# Altium footprint library ICs And Semiconductors SMD.PcbLib: 943 footprints (part 60 of 60)
Each footprint in its own frame and in the unit in brackets; x right, y up, seen from the top. Pads: shape width x height; smd on the part's side, far side on the other; paste and mask are expansions set on the pad; w line width, h text height; cw(c..) or ccw(c..) is an arc to the next point about the centre after c.
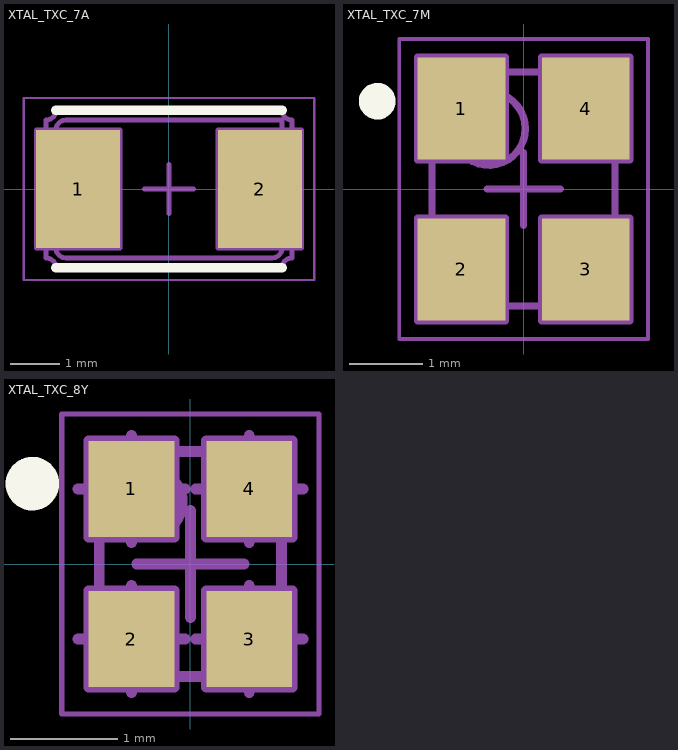
[diagram p59: the footprints below, top view; thin cyan lines are the x and y axes]

## XTAL_TXC_7A [mm] "2 Pins, 3.2x5mm, SMD Glass Seam Sealing Crystal, 7A Serie"
height 1.2
pads (2):
  rect 1.7x2.4 smd: 1(-1.85,0) 2(1.85,0)
Top Overlay:
  lines w0.2: -2.3,-1.6 2.3,-1.6 ; -2.3,1.6 2.3,1.6
Mechanical 8:
  lines w0.1: -2.35,0 -1.85,0 ; -1.85,-0.5 -1.85,0 ; -1.85,0.5 -1.85,0 ; -1.35,0 -1.85,0 ; -0.5,0 0,0 ; 0,-0.5 0,0 ; 0,0.5 0,0 ; 0.5,0 0,0 ; 1.35,0 1.85,0 ; 1.85,-0.5 1.85,0 ; 1.85,0.5 1.85,0 ; 2.35,0 1.85,0 ; -2.7,-1.2 -1,-1.2 -1,1.2 -2.7,1.2 -2.7,-1.2 ; 1,-1.2 2.7,-1.2 2.7,1.2 1,1.2 1,-1.2
Mechanical 14:
  lines w0.1: -2.5,-1.4 cw(c-2.5,-1.6) -2.3,-1.6 2.3,-1.6 cw(c2.5,-1.6) 2.5,-1.4 2.5,-0.5 cw(c2.5,-0.4) 2.4,-0.4 2.4,0.4 cw(c2.5,0.4) 2.5,0.5 2.5,1.4 cw(c2.5,1.6) 2.3,1.6 -2.3,1.6 cw(c-2.5,1.6) -2.5,1.4 -2.5,0.5 cw(c-2.5,0.4) -2.4,0.4 -2.4,-0.4 cw(c-2.5,-0.4) -2.5,-0.5 -2.5,-1.4 ; -2.3,-1.2 ccw(c-2.1,-1.2) -2.1,-1.4 2.1,-1.4 ccw(c2.1,-1.2) 2.3,-1.2 2.3,1.4 -2.1,1.4 ccw(c-2.1,1.2) -2.3,1.2 -2.3,-1.2
Mechanical 15:
  lines w0.05: -2.95,-1.85 2.95,-1.85 2.95,1.85 -2.95,1.85 -2.95,-1.85
3D body "XTAL_TXC_7A.stp": height 1.2, standoff 0, extent -2.501,-1.6 2.5,1.6

## XTAL_TXC_7M [mm] "4 Pins, 2.5x3.2mm, SMD Sealing Crystal, 7M Serie"
height 0.8
pads (4):
  rect 1.2x1.4 smd: 1(-0.85,1.1) 2(-0.85,-1.1) 3(0.85,-1.1) 4(0.85,1.1)
Top Overlay:
  circle w0.25: c-2,1.2 r0.125
Mechanical 8:
  lines w0.1: -1.35,-1.1 -0.85,-1.1 ; -1.35,1.1 -0.85,1.1 ; -0.85,-1.6 -0.85,-1.1 ; -0.85,-0.6 -0.85,-1.1 ; -0.85,0.6 -0.85,1.1 ; -0.85,1.6 -0.85,1.1 ; -0.5,0 0,0 ; -0.35,-1.1 -0.85,-1.1 ; -0.35,1.1 -0.85,1.1 ; 0,-0.5 0,0 ; 0,0.5 0,0 ; 0.35,-1.1 0.85,-1.1 ; 0.35,1.1 0.85,1.1 ; 0.5,0 0,0 ; 0.85,-1.6 0.85,-1.1 ; 0.85,-0.6 0.85,-1.1 ; 0.85,0.6 0.85,1.1 ; 0.85,1.6 0.85,1.1 ; 1.35,-1.1 0.85,-1.1 ; 1.35,1.1 0.85,1.1 ; -1.45,-1.8 -0.25,-1.8 -0.25,-0.4 -1.45,-0.4 -1.45,-1.8 ; -1.45,0.4 -0.25,0.4 -0.25,1.8 -1.45,1.8 -1.45,0.4 ; 0.25,-1.8 1.45,-1.8 1.45,-0.4 0.25,-0.4 0.25,-1.8 ; 0.25,0.4 1.45,0.4 1.45,1.8 0.25,1.8 0.25,0.4
Mechanical 14:
  circle w0.1: c-0.475,0.825 r0.5
  lines w0.1: -1.25,-1.5 cw(c-1.25,-1.6) -1.15,-1.6 1.15,-1.6 cw(c1.25,-1.6) 1.25,-1.5 1.25,1.5 cw(c1.25,1.6) 1.15,1.6 -1.15,1.6 cw(c-1.25,1.6) -1.25,1.5 -1.25,-1.5
Mechanical 15:
  lines w0.05: -1.7,-2.05 1.7,-2.05 1.7,2.05 -1.7,2.05 -1.7,-2.05
3D body "XTAL_TXC_7M.stp": height 0.8, standoff 0, extent -1.25,-1.6 1.25,1.6

## XTAL_TXC_8Y [mm] "4 Pins, 2x1.6mm, SMD Seam Sealing Crystal, 8Y Serie"
height 0.5
pads (4):
  rect 0.8x0.9 smd: 1(-0.55,0.7) 2(-0.55,-0.7) 3(0.55,-0.7) 4(0.55,0.7)
Top Overlay:
  circle w0.25: c-1.475,0.75 r0.125
Mechanical 8:
  lines w0.1: -1.05,-0.7 -0.55,-0.7 ; -1.05,0.7 -0.55,0.7 ; -0.55,-1.2 -0.55,-0.7 ; -0.55,-0.2 -0.55,-0.7 ; -0.55,0.2 -0.55,0.7 ; -0.55,1.2 -0.55,0.7 ; -0.5,0 0,0 ; -0.05,-0.7 -0.55,-0.7 ; -0.05,0.7 -0.55,0.7 ; 0,-0.5 0,0 ; 0,0.5 0,0 ; 0.05,-0.7 0.55,-0.7 ; 0.05,0.7 0.55,0.7 ; 0.5,0 0,0 ; 0.55,-1.2 0.55,-0.7 ; 0.55,-0.2 0.55,-0.7 ; 0.55,0.2 0.55,0.7 ; 0.55,1.2 0.55,0.7 ; 1.05,-0.7 0.55,-0.7 ; 1.05,0.7 0.55,0.7 ; -0.95,-1.15 -0.15,-1.15 -0.15,-0.25 -0.95,-0.25 -0.95,-1.15 ; -0.95,0.25 -0.15,0.25 -0.15,1.15 -0.95,1.15 -0.95,0.25 ; 0.15,-1.15 0.95,-1.15 0.95,-0.25 0.15,-0.25 0.15,-1.15 ; 0.15,0.25 0.95,0.25 0.95,1.15 0.15,1.15 0.15,0.25
Mechanical 14:
  circle w0.1: c-0.375,0.575 r0.3
  lines w0.1: -0.85,-0.95 cw(c-0.85,-1.05) -0.75,-1.05 0.75,-1.05 cw(c0.85,-1.05) 0.85,-0.95 0.85,0.95 cw(c0.85,1.05) 0.75,1.05 -0.75,1.05 cw(c-0.85,1.05) -0.85,0.95 -0.85,-0.95
Mechanical 15:
  lines w0.05: -1.2,-1.4 1.2,-1.4 1.2,1.4 -1.2,1.4 -1.2,-1.4
3D body "XTAL_TXC_8Y.stp": height 0.5, standoff 0, extent -0.85,-1.05 0.85,1.05